# Altium footprint library std-th.PcbLib: 171 footprints (part 10 of 11)
Each footprint in its own frame and in the unit in brackets; x right, y up, seen from the top. Pads: shape width x height; smd on the part's side, far side on the other; paste and mask are expansions set on the pad; w line width, h text height; cw(c..) or ccw(c..) is an arc to the next point about the centre after c.
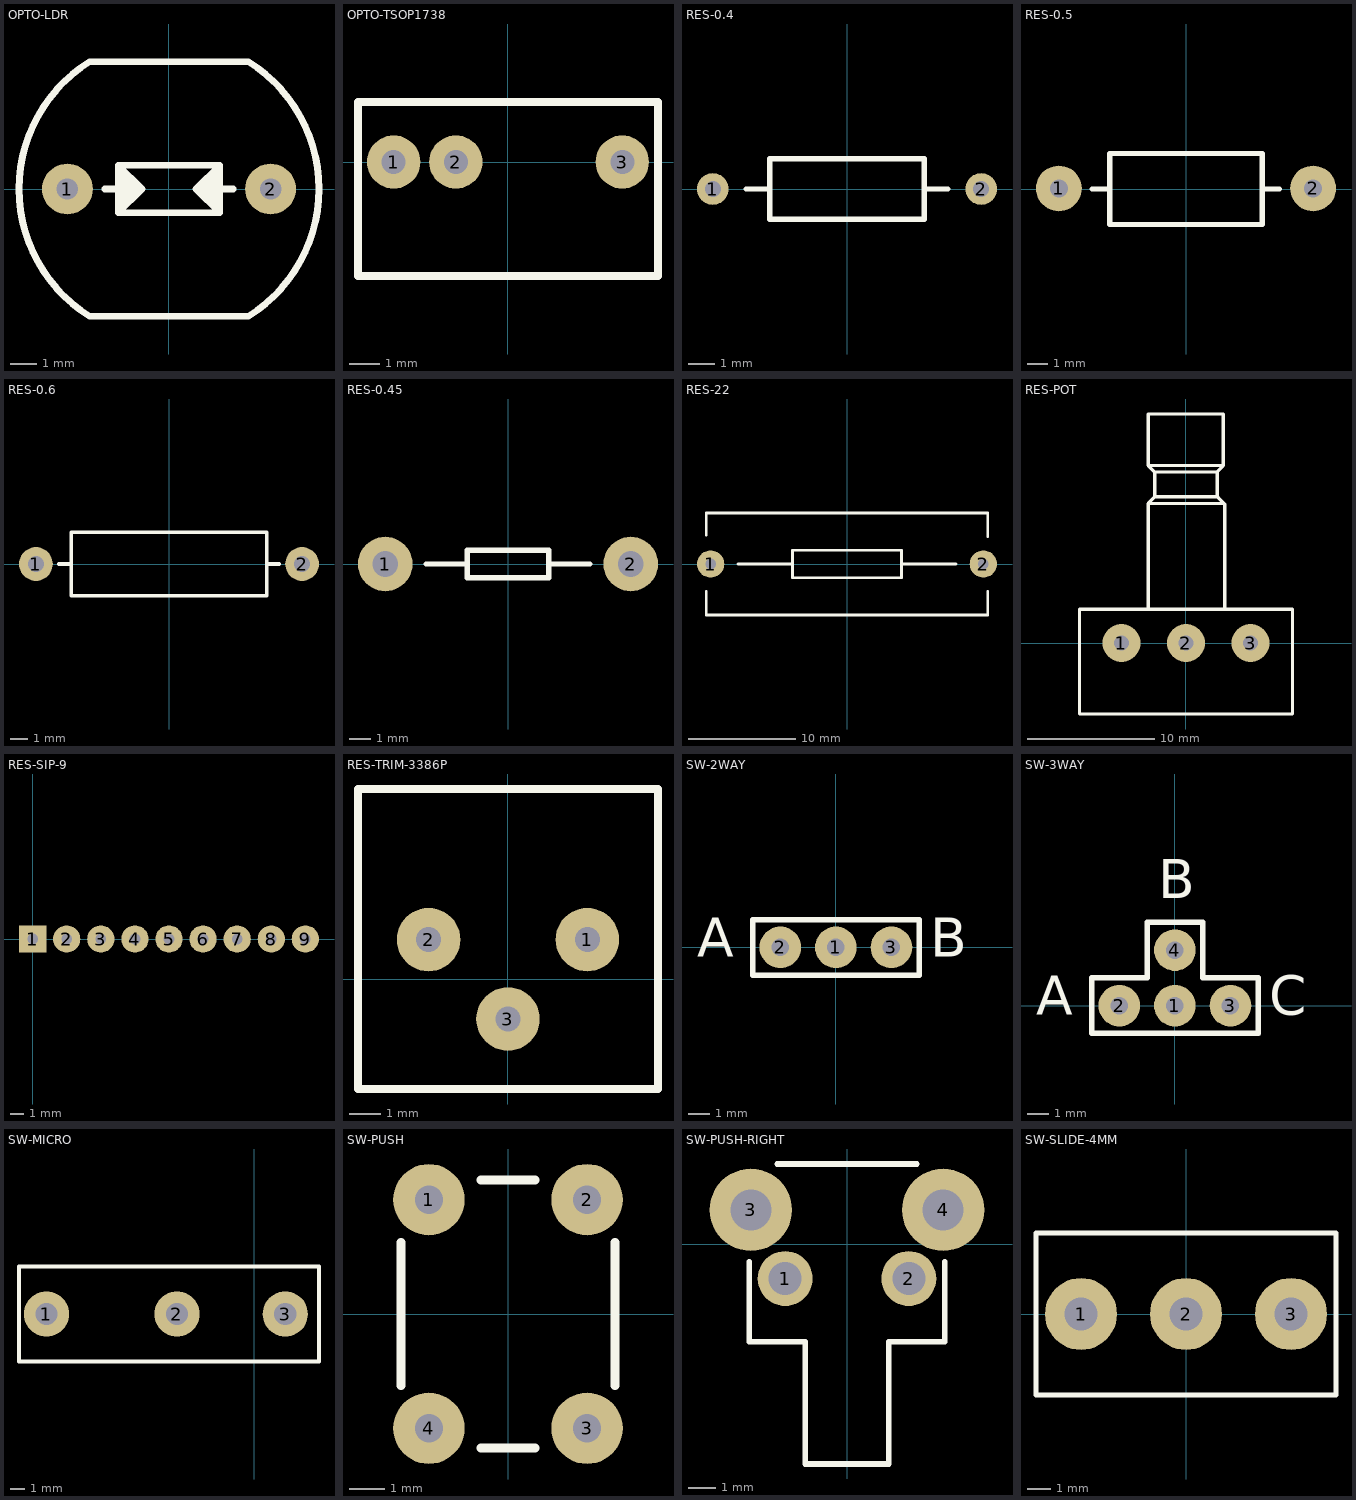
[diagram p9: the footprints below, top view; thin cyan lines are the x and y axes]

## OPTO-LDR [mm] "Light Dependent Resistor"
height 2
pads (2):
  round 1.905 hole 0.8: 1(-3.81,0) 2(3.81,0)
Top Overlay:
  region: 1.905,-0.889 1.016,0 1.905,0.889
  region: -1.905,0.889 -1.016,0 -1.905,-0.889
  lines w0.254: -2.413,0 -1.905,0 ; 1.905,0 2.413,0 ; -1.905,-0.889 -1.016,0 -1.905,0.889 ; -1.905,-0.889 -1.905,0.889 ; -1.905,-0.889 1.905,-0.889 ; -1.905,0.889 1.905,0.889 ; 1.905,-0.889 1.016,0 1.905,0.889 ; 1.905,-0.889 1.905,0.889 ; -2.973,-4.775 cw(c0,0) -2.973,4.775 2.973,4.775 cw(c0,0) 2.973,-4.775 -2.973,-4.775
3D body "User Library-PDV-P5001.STEP": height 2.38, standoff -36.5, extent -5.625,-4.775 5.625,4.775

## OPTO-TSOP1738 [mil] "Infrared sensor, digital, TSOP"
height 590.55
pads (3):
  round 70 hole 31.5: 1(-150,0) 2(-68.39,0) 3(150,0)
Top Overlay:
  lines w10: -196.84,-149.6 196.86,-149.6 196.86,78.75 -196.84,78.75 -196.84,-149.6
3D body "User Library-tsop1738-1.step": height 492.13, standoff -712.6, extent -196.84,-149.6 196.86,78.75

## RES-0.4 [mm] "Axial Resistor Thru-Hole; 2 Leads; 0.4 in Pin Spacing"
height 1.524
pads (2):
  round 1.2 hole 0.6: 1(-5.08,0) 2(5.08,0)
Top Overlay:
  lines w0.2: -3.81,0 -2.921,0 ; 2.921,-1.143 -2.921,-1.143 -2.921,1.143 2.921,1.143
  lines w0.203: 2.921,-1.143 2.921,1.143 ; 2.921,0 3.81,0
3D body "RES-0.4.step": height 2.93, standoff -2.54, extent -5.385,-1.156 5.385,1.156

## RES-0.5 [mil] "Weerstand, 1/2 W, 500 mil pitch"
height 196.85
pads (2):
  round 90 hole 35.43: 1(-250.01,1.09) 2(249.99,1.09)
Top Overlay:
  lines w10: -185,0 -150,0 ; 150,0 183.91,0 ; -150,-70 -150,70 150,70 150,-70 -150,-70
3D body "User Library-RES-1_5W.STEP": height 137.8, standoff -118.11, extent -260.63,-67.8 260.63,70

## RES-0.6 [mm] "Axial Resistor Thru-Hole; 2 Leads; 0.6 in Pin Spacing"
height 1.524
pads (2):
  round 1.905 hole 0.9: 1(-7.5,0) 2(7.5,0)
Top Overlay:
  lines w0.2: -6.223,0 -5.5,0 ; -5.5,-1.8 -5.5,1.8 5.5,1.8 5.5,-1.8 -5.5,-1.8
  lines w0.203: 5.5,0 6.223,0
3D body "RES-0.6.step": height 4.75, standoff -2, extent -7.85,-2.25 7.85,2.25

## RES-0.45 [mm] "Resistor, high current, 450 mil pitch"
height 5.08
pads (2):
  round 2.54 hole 1.2: 1(-5.715,0) 2(5.715,0)
Top Overlay:
  lines w0.254: -3.81,0 -1.905,0 ; 3.81,0 1.905,0 ; 1.905,0 1.905,-0.635 -1.905,-0.635 -1.905,0.635 1.905,0.635 1.905,0
3D body "User Library-615HR030E.step": height 6.5, standoff -2, extent -6.6,-1.2 6.6,1.2

## RES-22 [mm] "Resistor, 22 mm x 10 mm body, 1000 mil pitch, 5 W"
height 10
pads (2):
  round 2.54 hole 1: 1(-12.7,0) 2(12.7,0)
Top Overlay:
  lines w0.254: -13.1,-2.54 -13.1,-4.75 13.1,-4.75 13.1,-2.54 ; -13.1,2.686 -13.1,4.75 13.1,4.75 13.1,2.54 ; -10.16,0 -5.08,0 ; 5.08,0 10.16,0 ; -5.08,-1.27 -5.08,1.27 5.08,1.27 5.08,-1.27 -5.08,-1.27
3D body "User Library-Resistor 5W Length 22mm  pitch 1in.step": height 9, standoff -5.44, extent -13.1,-4.75 13.1,4.75

## RES-POT [mm] "Potentiometer, 200 mil pitch"
height 18
pads (3):
  round 3 hole 1.2: 1(-5.08,0) 2(0,0) 3(5.08,0)
Top Overlay:
  lines w0.254: -2.976,2.667 -2.978,2.669 -2.978,10.992 ; 2.496,11.513 -2.457,11.513 ; 2.921,13.956 2.906,13.972 -2.978,13.972 ; 2.991,10.992 -2.978,10.992 ; 3.048,2.669 3.048,10.936 2.46,11.524 2.46,13.462 ; -8.382,-5.588 8.382,-5.588 8.382,2.667 -8.382,2.667 -8.382,-5.588 ; -8.382,-5.588 -8.382,-5.588 ; -2.978,10.992 -2.921,11.049 -2.457,11.513 ; -2.978,13.972 -2.978,18.034 2.935,18.034 2.935,13.97 2.46,13.495 2.46,13.462 ; -2.978,13.972 -2.976,13.97 -2.965,13.97 -2.457,13.462 ; -2.457,11.513 -2.457,11.557 -2.457,13.462 ; -2.457,13.462 2.46,13.462
3D body "User Library-Potentiometer.step": height 21.08, standoff -3.86, extent -8.382,-5.588 8.382,18.542

## RES-SIP-9 [mil] "Resistor, network, 8 way common"
height 236.22
pads (9):
  rect 80x80 hole 31.5: 1(0,0)
  round 80 hole 31.5: 2(100,0) 3(200,0) 4(300,0) 5(400,0) 6(500,0) 7(600,0) 8(700,0) 9(800,0)
3D body "User Library-80015102.step": height 201.23, standoff -133.42, extent -41.33,-24.6 844.5,24.61

## RES-TRIM-3386P [mil] "Trimpot, 200 mil x 100 mil pitch"
height 314.96
pads (3):
  round 80 hole 31.5: 1(100,50) 2(-100,50) 3(0.04,-50)
Top Overlay:
  lines w10: -188.92,-138.18 189.03,-138.18 189.03,239.77 -188.92,239.77 -188.92,-138.18
3D body "SW3dPS-3386P-L.STEP": height 197.74, standoff -216.04, extent -188.92,-138.18 189.03,239.77

## SW-2WAY [mm] "2 way jumper"
height 8
pads (3):
  round 1.905 hole 0.8: 1(0,0) 2(-2.54,0) 3(2.54,0)
Top Overlay:
  lines w0.254: -3.81,1.27 -3.81,-1.27 3.81,-1.27 ; -3.81,1.27 -3.81,1.27 ; -3.81,1.27 3.81,1.27 3.81,-1.27 ; 3.81,-1.27 3.81,-1.27
  text "B" at 4.318,-1.016 h3.05
  text "A" at -6.35,-1.016 h3.05
3D body "User Library-Header1x2.STEP": height 8.44, standoff -2.54, extent -1.27,-1.27 3.81,1.27
3D body "User Library-Header1x2.STEP": height 8.44, standoff -2.54, extent -3.81,-1.27 1.27,1.27

## SW-3WAY [mm] "3 way jumper"
height 8
pads (4):
  round 1.905 hole 0.8: 1(0,0) 2(-2.54,0) 3(2.54,0) 4(0,2.54)
Top Overlay:
  lines w0.254: -3.81,1.27 -3.81,-1.27 3.81,-1.27 ; -3.81,1.27 -3.81,1.27 ; -3.81,1.27 -1.27,1.27 ; -1.27,1.27 -1.27,1.27 ; -1.27,1.27 -1.27,3.81 1.27,3.81 ; 1.27,3.81 1.27,3.81 ; 1.27,3.81 1.27,1.27 3.81,1.27 3.81,-1.27 ; 3.81,-1.27 3.81,-1.27
  text "C" at 4.318,-1.016 h3.05
  text "B" at -0.762,4.318 h3.05
  text "A" at -6.35,-1.016 h3.05
3D body "User Library-Header1x2.STEP": height 8.44, standoff -2.54, extent -1.27,-1.27 1.27,3.81
3D body "User Library-Header1x2.STEP": height 8.44, standoff -2.54, extent -1.27,-1.27 3.81,1.27
3D body "User Library-Header1x2.STEP": height 8.44, standoff -2.54, extent -3.81,-1.27 1.27,1.27

## SW-MICRO [mil] "Microswitch, 3 way"
height 472.44
pads (3):
  round 120 hole 59.06: 1(-551.97,500) 2(-205.52,500) 3(81.89,500)
Top Overlay:
  lines w10: -624.8,374.02 -624.8,625.99 171.37,625.99 171.37,374.02 -624.8,374.02
3D body "OMRON-SS_1GL2_FD_4.STEP": height 889.76, standoff -145.67, extent -624.8,374.02 171.37,625.99

## SW-PUSH [mm] "Switch, push button, tacticle, 6 x 4 mm"
height 4
pads (4):
  round 2.032 hole 0.8: 1(-2.25,3.25) 2(2.25,3.25) 3(2.25,-3.25) 4(-2.25,-3.25)
Top Overlay:
  lines w0.254: -3.048,-2.032 -3.048,2.032 ; -0.762,-3.81 0.762,-3.81 ; -0.762,3.81 0.762,3.81 ; 3.048,-2.032 3.048,2.032
3D body "User Library-Tactile switch 6x6x5mm.step": height 5.01, standoff -3.51, extent -3.015,-3.871 3.015,3.872

## SW-PUSH-RIGHT [mm] "Push button, right angle"
pads (4):
  round 2 hole 1.2: 1(-2.25,-1.25) 2(2.25,-1.25)
  round 3 hole 1.5: 3(-3.5,1.25) 4(3.5,1.25)
Top Overlay:
  lines w0.203: -3.556,-0.635 -3.556,-3.556 -1.524,-3.556 -1.524,-8.001 1.524,-8.001 1.524,-3.556 3.556,-3.556 3.556,-0.635 ; -2.54,2.921 2.54,2.921
3D body "User Library-SWITCH, TACTILE, RIGHT ANGLE, 12VDC, 50MA, 6_85MM ACTUATOR, WEALTH METAL TC-0244Z.step": height 7, standoff -4, extent -3.7,-8.08 3.7,2.92

## SW-SLIDE-4MM [mil] "Slide switch, 3 leads, 4 mm pitch"
height 521.65
pads (3):
  round 120 hole 55.12: 1(-175,0) 2(0,0) 3(175,0)
Top Overlay:
  lines w8: -250,-135 -250,135 250,135 250,-135 -250,-135
3D body "User Library-1825115-1.step": height 383, standoff -170, extent -216.5,-110 216.5,110